# Altium footprint library Iris.PcbLib: 90 footprints (part 6 of 6)
Each footprint in its own frame and in the unit in brackets; x right, y up, seen from the top. Pads: shape width x height; smd on the part's side, far side on the other; paste and mask are expansions set on the pad; w line width, h text height; cw(c..) or ccw(c..) is an arc to the next point about the centre after c.
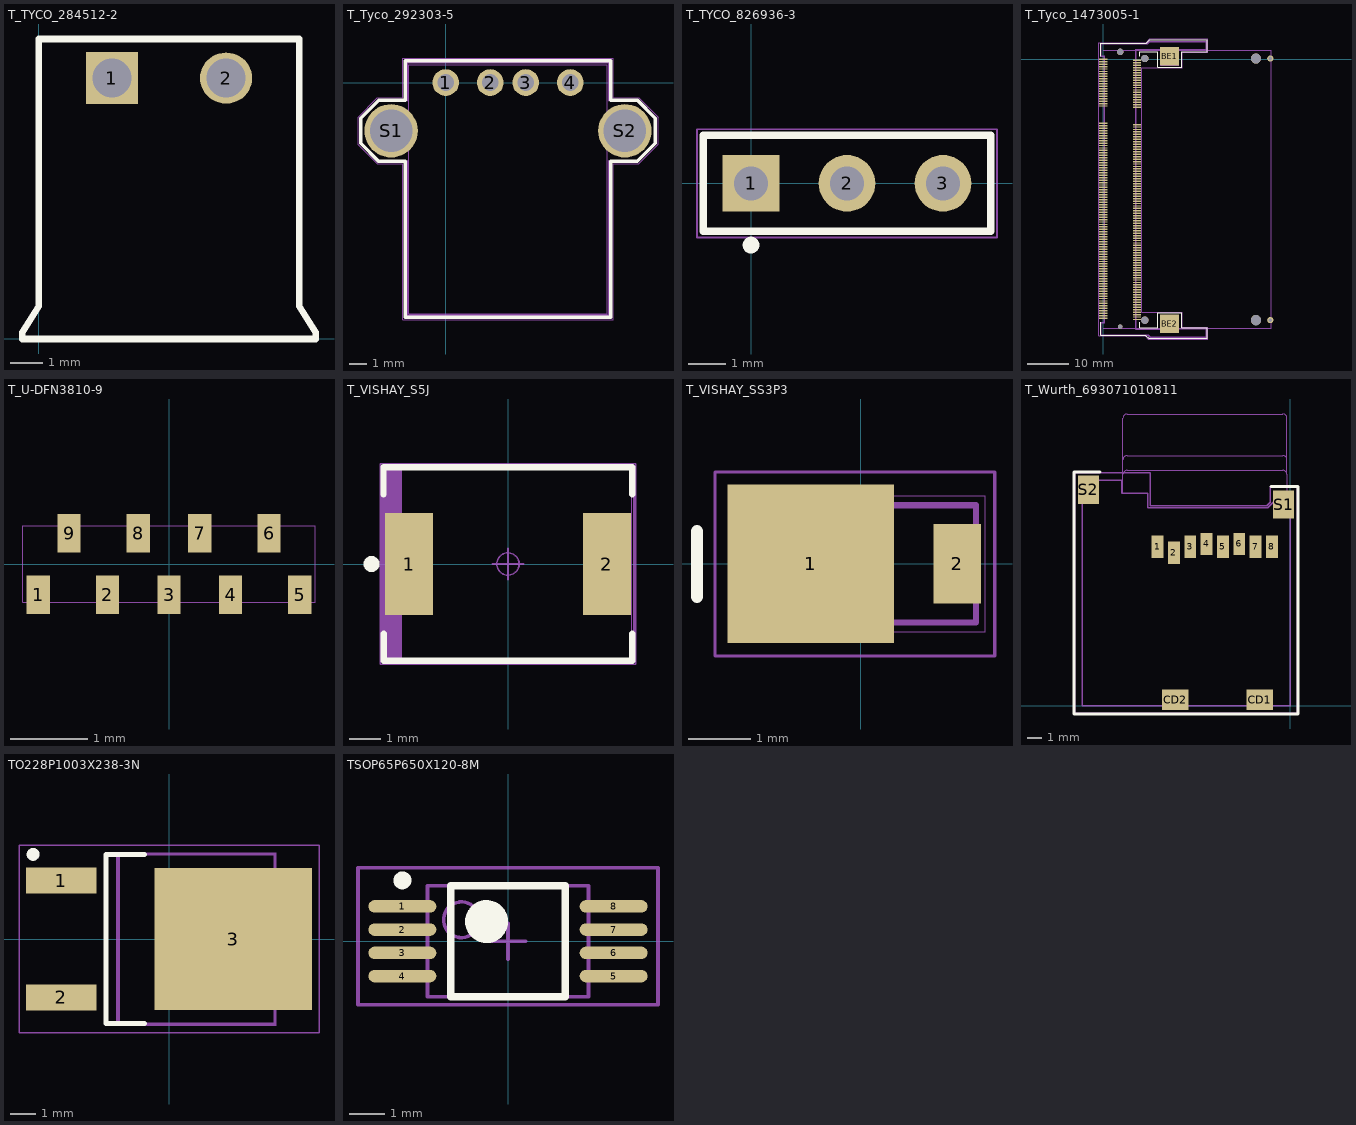
[diagram p5: the footprints below, top view; thin cyan lines are the x and y axes]

## T_TYCO_284512-2 [mm] "Power Connector 3.5mm"
height 7.3
pads (2):
  rect 1.6x1.6 hole 1.2: 1(2.25,8)
  oval 1.6x1.56 hole 1.2: 2(5.75,8)
Top Overlay:
  lines w0.2: -0.5,0 -0.5,0.2 0,1 0,9.2 8,9.2 8,1 8.5,0.2 8.5,0 -0.499,0
Mechanical 1:
  lines w0.05: -0.5,0 8.5,0 8.5,0.2 8,1 8,9.2 0,9.2 0,1 -0.5,0.2 -0.5,0
Mechanical 2:
  lines w0.001: -0.5,0 8.5,0 8.5,0.2 8,1 8,9.2 0,9.2 0,1 -0.5,0.2 -0.5,0
Mechanical 3:
  lines w0.1: -0.5,0 8.5,0 8.5,0.2 8,1 8,9.2 0,9.2 0,1 -0.5,0.2 -0.5,0
3D body: height 7.27, standoff -3.38, extent -0.5,0 8.5,9.2

## T_Tyco_292303-5 [mm] "USB Type A Connector"
height 7.01
pads (6):
  round 1.5 hole 0.95: 1(0,0) 2(2.5,0) 3(4.5,0) 4(7,0)
  round 3 hole 2.38: S1(-3.07,-2.71) S2(10.07,-2.71)
Top Overlay:
  lines w0.2: -4.78,-3.415 -3.78,-4.415 -2.27,-4.415 -2.27,-13.19 9.27,-13.19 9.27,-4.415 10.77,-4.415 11.78,-3.405 11.78,-1.995 10.78,-0.995 9.27,-0.995 9.27,1.23 -2.27,1.23 -2.27,-0.995 -3.77,-0.995 -4.78,-2.005 -4.78,-3.415
Mechanical 1:
  lines w0.05: -4.93,-3.485 -3.85,-4.565 -2.42,-4.565 -2.42,-13.34 9.42,-13.34 9.42,-4.565 10.84,-4.565 11.93,-3.475 11.93,-1.935 10.84,-0.845 9.42,-0.845 9.42,1.38 -2.42,1.38 -2.42,-0.845 -3.84,-0.845 -4.93,-1.935 -4.93,-3.485
Mechanical 2:
  lines w0.001: -2.065,-12.99 -2.065,1.01 9.065,1.01 9.065,-12.99 -2.065,-12.99
Mechanical 3:
  lines w0.1: -2.16,-13.09 -2.16,-4.405 ; -2.16,-13.08 9.16,-13.08 ; -2.16,-1.019 -2.16,1.11 9.16,1.11 9.16,-1.019 ; 9.16,-13.09 9.16,-4.405

## T_TYCO_826936-3 [mm] "Connector; Header; 3 Position"
height 8.4
pads (3):
  rect 1.5x1.5 hole 0.9: 1(0,0)
  round 1.5 hole 0.9: 2(2.54,0) 3(5.08,0)
Top Overlay:
  circle w0.254: c0,-1.635 r0.095
  lines w0.2: -1.27,-1.27 -1.27,1.27 6.35,1.27 6.35,-1.27 -1.27,-1.27
Mechanical 1:
  lines w0.05: -1.43,-1.43 -1.43,1.43 6.51,1.43 6.51,-1.43 -1.43,-1.43
Mechanical 2:
  lines w0.001: -1.27,-1.27 6.35,-1.27 6.35,1.27 -1.27,1.27 -1.27,-1.27
Mechanical 3:
  lines w0.1: -1.27,-1.27 6.35,-1.27 6.35,1.27 -1.27,1.27 -1.27,-1.27
3D body: height 8.4, standoff -2.52, extent -1.27,-1.27 6.35,1.27

## T_Tyco_1473005-1 [mm] "SODIMM Connector"
height 5.2
pads (210):
  rect 2x0.35 smd: 1(0,0) 2(8.2,-0.3) 3(0,-0.6) 4(8.2,-0.9) 5(0,-1.2) 6(8.2,-1.5) 7(0,-1.8) 8(8.2,-2.1) 9(0,-2.4) 10(8.2,-2.7) 11(0,-3) 12(8.2,-3.3) 13(0,-3.6) 14(8.2,-3.9) 15(0,-4.2) 16(8.2,-4.5) 17(0,-4.8) 18(8.2,-5.1) 19(0,-5.4) 20(8.2,-5.7) 21(0,-6) 22(8.2,-6.3) 23(0,-6.6) 24(8.2,-6.9) 25(0,-7.2) 26(8.2,-7.5) 27(0,-7.8) 28(8.2,-8.1) 29(0,-8.4) 30(8.2,-8.7) 31(0,-9) 32(8.2,-9.3) 33(0,-9.6) 34(8.2,-9.9) 35(0,-10.2) 36(8.2,-10.5) 37(0,-10.8) 38(8.2,-11.1) 39(0,-11.4) 40(8.2,-11.7) 41(0,-15.6) 42(8.2,-15.9) 43(0,-16.2) 44(8.2,-16.5) 45(0,-16.8) 46(8.2,-17.1) 47(0,-17.4) 48(8.2,-17.7) 49(0,-18) 50(8.2,-18.3) 51(0,-18.6) 52(8.2,-18.9) 53(0,-19.2) 54(8.2,-19.5) 55(0,-19.8) 56(8.2,-20.1) 57(0,-20.4) 58(8.2,-20.7) 59(0,-21) 60(8.2,-21.3) 61(0,-21.6) 62(8.2,-21.9) 63(0,-22.2) 64(8.2,-22.5) 65(0,-22.8) 66(8.2,-23.1) 67(0,-23.4) 68(8.2,-23.7) 69(0,-24) 70(8.2,-24.3) 71(0,-24.6) 72(8.2,-24.9) 73(0,-25.2) 74(8.2,-25.5) 75(0,-25.8) 76(8.2,-26.1) 77(0,-26.4) 78(8.2,-26.7) 79(0,-27) 80(8.2,-27.3) 81(0,-27.6) 82(8.2,-27.9) 83(0,-28.2) 84(8.2,-28.5) 85(0,-28.8) 86(8.2,-29.1) 87(0,-29.4) 88(8.2,-29.7) 89(0,-30) 90(8.2,-30.3) 91(0,-30.6) 92(8.2,-30.9) 93(0,-31.2) 94(8.2,-31.5) 95(0,-31.8) 96(8.2,-32.1) 97(0,-32.4) 98(8.2,-32.7) 99(0,-33) 100(8.2,-33.3) 101(0,-33.6) 102(8.2,-33.9) 103(0,-34.2) 104(8.2,-34.5) 105(0,-34.8) 106(8.2,-35.1) 107(0,-35.4) 108(8.2,-35.7) 109(0,-36) 110(8.2,-36.3) 111(0,-36.6) 112(8.2,-36.9) 113(0,-37.2) 114(8.2,-37.5) 115(0,-37.8) 116(8.2,-38.1) 117(0,-38.4) 118(8.2,-38.7) 119(0,-39) 120(8.2,-39.3) 121(0,-39.6) 122(8.2,-39.9) 123(0,-40.2) 124(8.2,-40.5) 125(0,-40.8) 126(8.2,-41.1) 127(0,-41.4) 128(8.2,-41.7) 129(0,-42) 130(8.2,-42.3) 131(0,-42.6) 132(8.2,-42.9) 133(0,-43.2) 134(8.2,-43.5) 135(0,-43.8) 136(8.2,-44.1) 137(0,-44.4) 138(8.2,-44.7) 139(0,-45) 140(8.2,-45.3) 141(0,-45.6) 142(8.2,-45.9) 143(0,-46.2) 144(8.2,-46.5) 145(0,-46.8) 146(8.2,-47.1) 147(0,-47.4) 148(8.2,-47.7) 149(0,-48) 150(8.2,-48.3) 151(0,-48.6) 152(8.2,-48.9) 153(0,-49.2) 154(8.2,-49.5) 155(0,-49.8) 156(8.2,-50.1) 157(0,-50.4) 158(8.2,-50.7) 159(0,-51) 160(8.2,-51.3) 161(0,-51.6) 162(8.2,-51.9) 163(0,-52.2) 164(8.2,-52.5) 165(0,-52.8) 166(8.2,-53.1) 167(0,-53.4) 168(8.2,-53.7) 169(0,-54) 170(8.2,-54.3) 171(0,-54.6) 172(8.2,-54.9) 173(0,-55.2) 174(8.2,-55.5) 175(0,-55.8) 176(8.2,-56.1) 177(0,-56.4) 178(8.2,-56.7) 179(0,-57) 180(8.2,-57.3) 181(0,-57.6) 182(8.2,-57.9) 183(0,-58.2) 184(8.2,-58.5) 185(0,-58.8) 186(8.2,-59.1) 187(0,-59.4) 188(8.2,-59.7) 189(0,-60) 190(8.2,-60.3) 191(0,-60.6) 192(8.2,-60.9) 193(0,-61.2) 194(8.2,-61.5) 195(0,-61.8) 196(8.2,-62.1) 197(0,-62.4) 198(8.2,-62.7) 199(0,-63) 200(8.2,-63.3)
  rect 4.6x4.5 smd: BE1(16.1,0.75) BE2(16.1,-64.35)
  round 1.1 hole 1.1 unplated: ""(4.1,-65.05)
  round 1.6 hole 1.6 unplated: ""(4.1,1.75)
  round 1.8 hole 1.8 unplated: ""(10.1,-63.45) ""(10.1,0.15)
  round 2.5 hole 2.5 unplated: ""(37.1,-63.45) ""(37.1,0.15)
  round 1.5 hole 0.9: ""(40.6,-63.45) ""(40.6,0.15)
Top Overlay:
  lines w0.2: -0.635,-63.962 -0.635,-67.1 7,-67.1 ; -0.635,0.715 -0.635,3.881 6.969,3.881 6.97,3.88 10.48,3.88 11.35,4.75 25.273,4.75 25.273,1.85 19.05,1.85 19.05,-1.951 13.2,-1.951 13.2,1.75 8.9,1.75 8.9,0.715 ; 6.95,-67.1 10.25,-67.1 11.05,-67.9 25.273,-67.9 25.273,-65.35 ; 8.9,-65.3 13.208,-65.3 13.208,-61.641 19.05,-61.641 19.05,-65.35 25.2,-65.35 ; 8.9,-65.282 8.9,-63.962
Mechanical 1:
  lines w0.05: -1.141,-67.249 -1.141,4.028 10.42,4.028 11.289,4.897 25.42,4.897 25.42,1.705 19.2,1.705 19.2,-2.1 9.374,-2.1 9.374,-61.502 19.191,-61.502 19.191,-65.211 25.413,-65.211 25.413,-68.043 11.251,-68.043 10.983,-68.043 10.189,-67.249 -1.141,-67.249
Mechanical 2:
  lines w0.001: -0.002,-65.45 40.8,-65.45 40.8,2.15 0,2.15 ; -0.635,-67.102 -0.635,-63.962 0.254,-63.962 0.254,0.716 -0.635,0.716 -0.635,3.891 6.223,3.891 10.795,3.891 11.303,4.399 25.146,4.399 25.146,2.24 18.288,2.24 18.288,-1.443 13.97,-1.443 13.97,2.24 8.001,2.24 8.001,-65.451 13.97,-65.451 13.97,-62.276 18.288,-62.276 18.288,-65.451 25.146,-65.451 25.146,-67.61 11.303,-67.61 10.795,-67.102 6.223,-67.102 -0.635,-67.102
Mechanical 3:
  lines w0.1: -0.508,-66.975 -0.508,-64.054 0.381,-64.054 0.381,0.843 -0.508,0.843 -0.508,3.764 5.969,3.764 10.795,3.764 11.303,4.272 25.019,4.272 25.019,2.367 18.161,2.367 18.161,-1.189 14.097,-1.189 14.097,2.367 7.874,2.367 7.874,-65.705 14.097,-65.705 14.097,-62.403 18.161,-62.403 18.161,-65.578 25.019,-65.578 25.019,-67.483 11.43,-67.483 10.922,-66.975 5.969,-66.975 -0.508,-66.975
3D body: height 5.22, standoff -0.68, extent -0.9,-67.4 25.15,4.1

## T_U-DFN3810-9 [mm] "U-DFN3810-9 (Type B), SMD, 3.8mm X 1.0mm X 0.5mm, 9 pin"
height 0.55
pads (9):
  rect 0.3x0.5 smd: 1(-1.7,-0.4) 2(-0.8,-0.4) 3(0,-0.4) 4(0.8,-0.4) 5(1.7,-0.4) 6(1.3,0.4) 7(0.4,0.4) 8(-0.4,0.4) 9(-1.3,0.4)
Mechanical 2:
  lines w0.01: -1.9,-0.5 -1.9,0.5 1.9,0.5 1.9,-0.5 -1.9,-0.5
3D body: height 0.55, standoff -0.02, extent -1.9,-0.5 1.9,0.5

## T_VISHAY_S5J [mm] "5A Rectifier"
height 2.62
pads (2):
  rect 1.52x3.2 smd: 1(-3.105,0) 2(3.105,0)
Top Overlay:
  circle w0.25: c-4.28,0 r0.125
  lines w0.2: -3.906,2.187 -3.906,3.032 3.902,3.032 3.902,2.187 ; -3.893,-2.187 -3.893,-3.032 3.902,-3.032 3.902,-2.187
Mechanical 1:
  circle w0.05: c0,0 r0.35
  lines w0.05: -0.5,0 0.5,0 ; 0,-0.5 0,0.5 ; -4.001,-3.141 4.001,-3.141 4.001,3.141 -4.001,3.141 -4.001,-3.141
Mechanical 2:
  lines w0.001: -3.875,-3.11 3.875,-3.11 3.875,3.11 -3.875,3.11 -3.875,-3.11
Mechanical 3:
  lines w0.1: -3.879,-3.032 -3.879,3.032 ; -3.777,-3.032 -3.777,3.032 ; -3.676,-3.032 -3.676,3.032 ; -3.575,-3.032 -3.575,3.032 ; -3.474,-3.032 -3.474,3.032 ; -3.373,-3.032 -3.373,3.032 ; -3.929,-3.032 3.978,-3.032 3.978,3.032 -3.929,3.032 -3.929,-3.032

## T_VISHAY_SS3P3 [mm] "Schottky Barrier Rectifiers. 2-Leads, Body 3.7x1.88mm"
height 1.15
pads (2):
  rect 2.67x2.54 smd: 1(-0.8,0)
  rect 0.762x1.27 smd: 2(1.551,0)
Top Overlay:
  lines w0.2: -2.628,-0.529 -2.628,0.521
Mechanical 1:
  lines w0.05: -2.339,-1.482 2.15,-1.482 2.15,1.476 -2.339,1.476 -2.339,-1.482
Mechanical 2:
  lines w0.001: -1.7,-1.09 -1.7,1.09 ; -1.3,-1.09 -1.3,1.09 ; -2,-1.09 2,-1.09 2,1.09 -2,1.09 -2,-1.09
Mechanical 3:
  rectangle: -1.9,-0.94 -1.443,0.94
  lines w0.1: -1.85,-0.94 1.85,-0.94 1.85,0.94 -1.85,0.94 ; -1.7,-0.9 -1.7,0.9
3D body: height 1.15, standoff 0, extent -1.7,-1.09 -1.3,1.09
3D body: height 0.35, standoff 0, extent -2,-0.675 -1.7,0.675
3D body: height 1.15, standoff 0, extent -1.3,-1.09 -0.84,1.09
3D body: height 1.15, standoff 0, extent -0.84,-1.09 1.55,1.09
3D body: height 0.35, standoff 0, extent 1.55,-0.455 2,0.455

## T_Wurth_693071010811 [mm] "MicroSD Holder, Push-Pust Type,"
height 1.98
pads (12):
  rect 0.8x1.5 smd: 1(-8.94,10.7) 2(-7.84,10.3) 3(-6.74,10.7) 4(-5.64,10.9) 5(-4.54,10.7) 6(-3.44,10.9) 7(-2.34,10.7) 8(-1.24,10.7)
  rect 1.8x1.4 smd: CD1(-2.05,0.4) CD2(-7.75,0.4)
  rect 1.4x1.9 smd: S1(-0.45,13.55) S2(-13.6,14.55)
Top Overlay:
  lines w0.2: -12.802,15.748 -14.554,15.748 -14.554,-0.559 0.508,-0.559 0.508,14.757 -1.295,14.757
Mechanical 1:
  lines w0.1: -14.503,-0.508 0.457,-0.508 0.457,14.707 -1.346,14.707 -1.346,13.691 -1.575,13.462 -9.423,13.462 -9.423,15.697 -14.503,15.697 -14.503,-0.508
Mechanical 2:
  lines w0.01: -11.27,14.326 -11.27,15.575 ; -11.27,16.575 cw(c-10.995,16.575) -10.995,16.85 -0.495,16.85 cw(c-0.495,16.575) -0.22,16.575 ; -0.22,14.2 -0.22,15.575 ccw(c-0.495,15.575) -0.495,15.85 -10.995,15.85 ccw(c-10.995,15.575) -11.27,15.575 ; -0.22,15.578 -0.22,19.375 ccw(c-0.495,19.375) -0.495,19.65 -10.995,19.65 ccw(c-10.995,19.375) -11.27,19.375 -11.27,15.575 ; -14,0 0,0 0,14.2 -0.659,14.2 -1.524,13.335 -9.601,13.335 -9.601,14.326 -11.354,14.326 -11.354,15.2 -14,15.2 -14,0
Mechanical 3:
  lines w0.1: -14,0 0,0 0,14.2 -0.659,14.2 -1.524,13.335 -9.601,13.335 -9.601,14.326 -11.354,14.326 -11.354,15.2 -14,15.2 -14,0
3D body: height 1.8, standoff 0.69, extent -11.269,4.623 -0.22,19.65
3D body: height 1.83, standoff -0.07, extent -14,0 0,15.2

## TO228P1003X238-3N [mm]
pads (3):
  rect 2.75x1 smd: 1(-4.2,2.28) 2(-4.2,-2.28)
  rect 6.15x5.55 smd: 3(2.5,0)
Top Overlay:
  circle w0.25: c-5.3,3.3 r0.125
  lines w0.2: -0.95,-3.3 -2.45,-3.3 -2.45,3.3 -0.95,3.3
Top Paste:
  region: 2.86,0.36 4.86,0.36 4.86,2.06 2.86,2.06
  region: 0.14,0.36 2.14,0.36 2.14,2.06 0.14,2.06
  region: 2.86,-2.06 4.86,-2.06 4.86,-0.36 2.86,-0.36
  region: 0.14,-2.06 2.14,-2.06 2.14,-0.36 0.14,-0.36
Mechanical 1:
  circle w0.05: c0,0 r0.35
  lines w0.05: -0.5,0 0.5,0 ; 0,-0.5 0,0.5 ; -5.85,-3.65 -5.85,3.65 5.85,3.65 5.85,-3.65 -5.85,-3.65
Mechanical 2:
  lines w0.001: -2.032,-3.365 -2.032,3.365 4.188,3.365 4.188,-3.365 -2.032,-3.365
Mechanical 3:
  lines w0.1: 4.125,-2.668 4.419,-2.668 5.015,-2.006 5.015,2.006 4.419,2.668 4.125,2.668 ; -1.97,-3.302 -1.97,3.302 4.125,3.302 4.125,-3.302 -1.97,-3.302

## TSOP65P650X120-8M [mm] "TSOP, 8-Leads, Body 3.1x4.5mm (max), Pitch 0.65mm, IPC Low Density"
height 1.2
pads (8):
  oval 1.9x0.35 smd: 1(-2.95,0.975) 2(-2.95,0.325) 3(-2.95,-0.325) 4(-2.95,-0.975) 5(2.95,-0.975) 6(2.95,-0.325) 7(2.95,0.325) 8(2.95,0.975)
Top Overlay:
  circle w0.25: c-2.95,1.7 r0.125
  circle w0.6: c-0.6,0.55 r0.3
  lines w0.2: -1.6,-1.55 -1.6,1.55 1.6,1.55 1.6,-1.55 -1.6,-1.55
Mechanical 1:
  lines w0.1: -0.5,0 0.5,0 ; 0,-0.5 0,0.5 ; -4.191,-1.778 -4.191,2.05 4.191,2.05 4.191,-1.778 -4.191,-1.778
Mechanical 3:
  circle w0.1: c-1.3,0.6 r0.5
  lines w0.1: -2.25,-1.55 -2.25,1.55 2.25,1.55 2.25,-1.55 -2.25,-1.55
3D body: height 1.2, standoff 0, extent -3.2,-1.5 3.2,1.5